# Altium footprint library PcbLib.PcbLib: 428 footprints (part 19 of 27)
Each footprint in its own frame and in the unit in brackets; x right, y up, seen from the top. Pads: shape width x height; smd on the part's side, far side on the other; paste and mask are expansions set on the pad; w line width, h text height; cw(c..) or ccw(c..) is an arc to the next point about the centre after c.
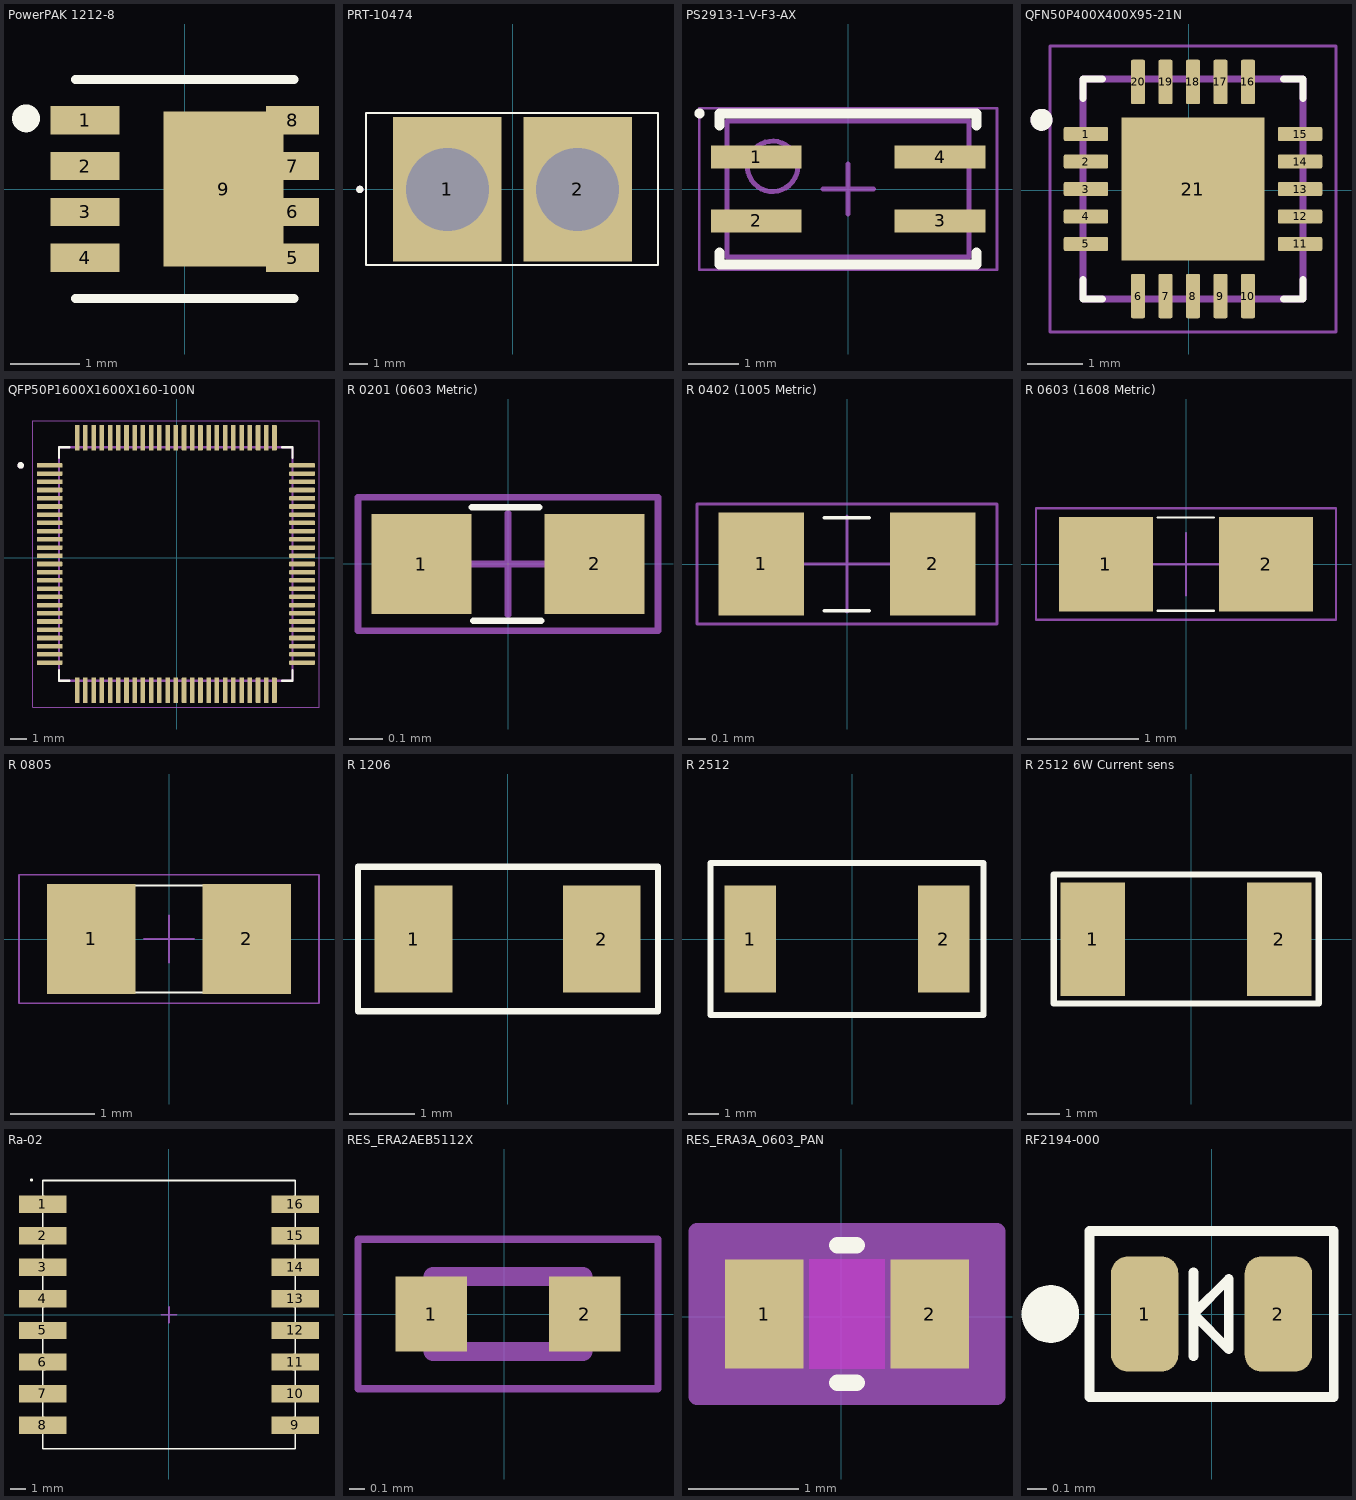
[diagram p18: the footprints below, top view; thin cyan lines are the x and y axes]

## PowerPAK 1212-8 [mm]
pads (9):
  rect 0.99x0.405 smd: 1(-1.435,0.99) 2(-1.435,0.33) 3(-1.435,-0.33) 4(-1.435,-0.99)
  rect 0.76x0.405 smd: 5(1.55,-0.99) 6(1.55,-0.33) 7(1.55,0.33) 8(1.55,0.99)
  rect 1.725x2.235 smd: 9(0.557,0)
Top Overlay:
  circle w0.2: c-2.286,1.016 r0.1
  lines w0.127: -1.575,-1.575 1.575,-1.575 ; -1.575,1.575 1.575,1.575
3D body "SI7611DN-T1-GE3.step": height 1.12, standoff 0, extent -1.651,-1.651 1.651,1.651

## PRT-10474 [mm]
pads (2):
  rect 6x8 hole 4.6: 1(-3.6,0) 2(3.6,0)
Top Overlay:
  circle w0.2: c-8.45,0 r0.1
  lines w0.127: -8.11,-4.18 -8.11,4.22 8.05,4.22 8.05,-4.18 -8.11,-4.18
Mechanical 13:
  circle w0.2: c-8.45,0 r0.1
3D body "XT60 Plug v4.step": height 17, standoff -4.4, extent -8.04,-3.94 7.96,3.96

## PS2913-1-V-F3-AX [mm] "SON, 4-Leads, Body 2.50x4.60mm, Pitch 1.27mm, IPC Medium Density"
height 2.1
pads (4):
  rect 1.8x0.45 smd: 1(-1.825,0.635) 2(-1.825,-0.635) 3(1.825,-0.635) 4(1.825,0.635)
Top Overlay:
  circle w0.1: c-2.95,1.5 r0.05
  lines w0.2: -2.55,-1.26 -2.55,-1.5 2.55,-1.5 2.55,-1.26 ; -2.55,1.26 -2.55,1.5 2.55,1.5 2.55,1.26
Mechanical 13:
  circle w0.1: c-1.5,0.45 r0.5
  lines w0.1: -2.4,-1.35 -2.4,1.35 2.4,1.35 2.4,-1.35 -2.4,-1.35
Mechanical 15:
  lines w0.05: -2.955,-1.6 -2.955,1.6 2.955,1.6 2.955,-1.6 -2.955,-1.6
  lines w0.1: -0.5,0 0.5,0 ; 0,-0.5 0,0.5
3D body "SON127P460X210-4N.step": height 2.1, standoff 0.05, extent -2.4,-1.35 2.4,1.35

## QFN50P400X400X95-21N [mm]
pads (21):
  rrect25% 0.81x0.26 smd: 1(-1.874,1.025) 2(-1.874,0.525) 3(-1.874,0.025) 4(-1.874,-0.475) 5(-1.874,-0.975) 11(2.026,-0.975) 12(2.026,-0.475) 13(2.026,0.025) 14(2.026,0.525) 15(2.026,1.025)
  rrect25% 0.26x0.81 smd: 6(-0.924,-1.925) 7(-0.424,-1.925) 8(0.076,-1.925) 9(0.576,-1.925) 10(1.076,-1.925) 16(1.076,1.975) 17(0.576,1.975) 18(0.076,1.975) 19(-0.424,1.975) 20(-0.924,1.975)
  rect 2.6x2.6 smd paste-2: 21(0.076,0.025)
Top Overlay:
  circle w0.2: c-2.684,1.285 r0.1
  lines w0.127: -1.924,-1.625 -1.924,-1.975 -1.574,-1.975 ; -1.924,1.675 -1.924,2.025 -1.574,2.025 ; 1.726,-1.975 2.076,-1.975 2.076,-1.625 ; 1.726,2.025 2.076,2.025 2.076,1.675
Top Paste:
  region: 1.056,0.186 0.236,0.186 0.236,1.005 1.056,1.005
  region: -0.084,0.186 -0.905,0.186 -0.905,1.005 -0.084,1.005
  region: -0.084,-0.955 -0.904,-0.955 -0.904,-0.135 -0.084,-0.135
  region: 1.056,-0.955 0.236,-0.955 0.236,-0.135 1.056,-0.135
Mechanical 13:
  circle w0.2: c-2.684,1.285 r0.1
  lines w0.127: -1.924,-1.975 2.076,-1.975 2.076,2.025 -1.924,2.025 -1.924,-1.975
Mechanical 15:
  lines w0.05: -2.529,-2.58 2.681,-2.58 2.681,2.63 -2.529,2.63 -2.529,-2.58
3D body "step_temp.STEP": height 0.95, standoff 0, extent -1.924,-1.975 2.076,2.025

## QFP50P1600X1600X160-100N [mm]
pads (100):
  rrect25% 1.56x0.28 smd: 1(-7.731,5.619) 2(-7.731,5.119) 3(-7.731,4.619) 4(-7.731,4.119) 5(-7.731,3.619) 6(-7.731,3.119) 7(-7.731,2.619) 8(-7.731,2.119) 9(-7.731,1.619) 10(-7.731,1.119) 11(-7.731,0.619) 12(-7.731,0.119) 13(-7.731,-0.381) 14(-7.731,-0.881) 15(-7.731,-1.381) 16(-7.731,-1.881) 17(-7.731,-2.381) 18(-7.731,-2.881) 19(-7.731,-3.381) 20(-7.731,-3.881) 21(-7.731,-4.381) 22(-7.731,-4.881) 23(-7.731,-5.381) 24(-7.731,-5.881) 25(-7.731,-6.381) 51(7.629,-6.381) 52(7.629,-5.881) 53(7.629,-5.381) 54(7.629,-4.881) 55(7.629,-4.381) 56(7.629,-3.881) 57(7.629,-3.381) 58(7.629,-2.881) 59(7.629,-2.381) 60(7.629,-1.881) 61(7.629,-1.381) 62(7.629,-0.881) 63(7.629,-0.381) 64(7.629,0.119) 65(7.629,0.619) 66(7.629,1.119) 67(7.629,1.619) 68(7.629,2.119) 69(7.629,2.619) 70(7.629,3.119) 71(7.629,3.619) 72(7.629,4.119) 73(7.629,4.619) 74(7.629,5.119) 75(7.629,5.619)
  rrect25% 0.28x1.56 smd: 26(-6.051,-8.061) 27(-5.551,-8.061) 28(-5.051,-8.061) 29(-4.551,-8.061) 30(-4.051,-8.061) 31(-3.551,-8.061) 32(-3.051,-8.061) 33(-2.551,-8.061) 34(-2.051,-8.061) 35(-1.551,-8.061) 36(-1.051,-8.061) 37(-0.551,-8.061) 38(-0.051,-8.061) 39(0.449,-8.061) 40(0.949,-8.061) 41(1.449,-8.061) 42(1.949,-8.061) 43(2.449,-8.061) 44(2.949,-8.061) 45(3.449,-8.061) 46(3.949,-8.061) 47(4.449,-8.061) 48(4.949,-8.061) 49(5.449,-8.061) 50(5.949,-8.061) 76(5.949,7.299) 77(5.449,7.299) 78(4.949,7.299) 79(4.449,7.299) 80(3.949,7.299) 81(3.449,7.299) 82(2.949,7.299) 83(2.449,7.299) 84(1.949,7.299) 85(1.449,7.299) 86(0.949,7.299) 87(0.449,7.299) 88(-0.051,7.299) 89(-0.551,7.299) 90(-1.051,7.299) 91(-1.551,7.299) 92(-2.051,7.299) 93(-2.551,7.299) 94(-3.051,7.299) 95(-3.551,7.299) 96(-4.051,7.299) 97(-4.551,7.299) 98(-5.051,7.299) 99(-5.551,7.299) 100(-6.051,7.299)
Top Overlay:
  circle w0.2: c-9.491,5.619 r0.1
  lines w0.127: -7.151,-6.841 -7.151,-7.481 -6.511,-7.481 ; -7.151,6.079 -7.151,6.719 -6.511,6.719 ; 6.409,-7.481 7.049,-7.481 7.049,-6.841 ; 6.409,6.719 7.049,6.719 7.049,6.079
Mechanical 13:
  circle w0.2: c-9.491,5.619 r0.1
  lines w0.127: -7.151,-7.481 -7.151,6.719 7.049,6.719 7.049,-7.481 -7.151,-7.481
Mechanical 15:
  lines w0.05: -8.761,-9.091 -8.761,8.329 8.659,8.329 8.659,-9.091 -8.761,-9.091
3D body "step_temp.STEP": height 1.6, standoff 0, extent -8.051,-8.381 7.949,7.619

## R 0201 (0603 Metric) [mm]
pads (2):
  rect 0.3x0.3 smd paste+0 mask+0: 1(-0.26,0) 2(0.26,0)
Top Overlay:
  lines w0.02: -0.109,0.17 0.094,0.17 ; -0.104,-0.171 0.099,-0.17
Mechanical 15:
  lines w0.02: -0.254,0 0.254,0 ; 0,-0.152 0,0.152 ; -0.45,-0.2 0.45,-0.2 0.45,0.2 -0.45,0.2 -0.45,-0.2
3D body "User Library-res0201-1.STEP": height 0.23, standoff 0, extent -0.3,-0.15 0.3,0.15

## R 0402 (1005 Metric) [mm] "Chip Capacitor, Body 1.0x0.5mm, IPC High Density"
height 1.3
pads (2):
  rect 0.5x0.6 smd: 1(-0.5,0) 2(0.5,0)
Top Overlay:
  lines w0.02: -0.132,-0.272 0.13,-0.272 ; -0.132,0.271 0.13,0.271
Mechanical 15:
  lines w0.02: -0.3,0 0.3,0 ; 0,-0.279 0,0.279 ; -0.875,-0.35 0.875,-0.35 0.875,0.35 -0.875,0.35 -0.875,-0.35
3D body "User Library-CR1005-0402.STEP": height 0.35, standoff 0, extent -0.5,-0.25 0.5,0.25

## R 0603 (1608 Metric) [mm]
pads (2):
  rect 0.85x0.85 smd paste+0 mask+0: 1(-0.72,0) 2(0.72,0)
Top Overlay:
  lines w0.02: -0.257,-0.419 0.251,-0.419 ; -0.257,0.42 0.251,0.42
Mechanical 15:
  lines w0.02: -0.3,0 0.3,0 ; 0,-0.279 0,0.279 ; -1.35,-0.5 -1.35,0.505 1.35,0.505 1.35,-0.5 -1.35,-0.5
3D body "SW3dPS-R0603.STEP": height 0.37, standoff 0, extent -0.8,-0.401 0.8,0.401

## R 0805 [mm]
pads (2):
  rect 1.05x1.3 smd paste+0 mask+0: 1(-0.923,0) 2(0.923,0)
Top Overlay:
  lines w0.02: -0.559,-0.635 0.533,-0.635 ; -0.546,0.635 0.546,0.635
Mechanical 15:
  lines w0.02: -0.3,0 0.3,0 ; 0,-0.279 0,0.279 ; -1.778,-0.762 -1.778,0.762 1.778,0.762 1.778,-0.762 -1.778,-0.762
3D body "SW3dPS-R0805.STEP": height 0.47, standoff 0, extent -1,-0.626 1,0.626

## R 1206 [mm]
pads (2):
  rect 1.2x1.65 smd: 1(-1.45,0) 2(1.45,0)
Top Overlay:
  lines w0.1: -2.308,-1.112 -2.308,1.116 2.317,1.116 2.317,-1.112 -2.308,-1.112
3D body "User Library-1206CRCW.step": height 0.56, standoff 0, extent -1.583,-0.792 1.617,0.808

## R 2512 [mm]
pads (2):
  rect 1.7x3.5 smd: 1(-3.345,0) 2(3.011,0)
Top Overlay:
  lines w0.2: -4.655,-2.5 -4.655,2.5 -3.5,2.5 4.312,2.5 4.312,-2.5 -4.655,-2.5
3D body "RMCF2512.stp": height 0.54, standoff -0.01, extent -3.282,-1.603 3.018,1.597

## R 2512 6W Current sens [mm]
pads (2):
  rect 2x3.5 smd: 1(-3.045,0) 2(2.711,0)
Top Overlay:
  lines w0.2: -4.24,-1.98 3.93,-1.98 3.93,2 -4.24,2 -4.24,-1.98
3D body "RES_L500x_BRN.step": height 1.22, standoff 0, extent -3.358,-1.593 3.118,1.633

## Ra-02 [mm] "Chip Array, Concave, 16-Leads, Pitch 2.00mm,  Body 17.00x16.00mm,  IPC Medium Density"
height 0.6
pads (16):
  rect 3x1.1 smd: 1(-8,7) 2(-8,5) 3(-8,3) 4(-8,1) 5(-8,-1) 6(-8,-3) 7(-8,-5) 8(-8,-7) 9(8,-7) 10(8,-5) 11(8,-3) 12(8,-1) 13(8,1) 14(8,3) 15(8,5) 16(8,7)
Top Overlay:
  circle w0.1: c-8.712,8.538 r0.05
  lines w0.1: -8,-8.5 -8,-7.5 ccw(c-8,-7) -8,-6.5 -8,-5.5 ccw(c-8,-5) -8,-4.5 -8,-3.5 ccw(c-8,-3) -8,-2.5 -8,-1.5 ccw(c-8,-1) -8,-0.5 -8,0.5 ccw(c-8,1) -8,1.5 -8,2.5 ccw(c-8,3) -8,3.5 -8,4.5 ccw(c-8,5) -8,5.5 -8,6.5 ccw(c-8,7) -8,7.5 -8,8.5 8,8.5 8,7.5 ccw(c8,7) 8,6.5 8,5.5 ccw(c8,5) 8,4.5 8,3.5 ccw(c8,3) 8,2.5 8,1.5 ccw(c8,1) 8,0.5 8,-0.5 ccw(c8,-1) 8,-1.5 8,-2.5 ccw(c8,-3) 8,-3.5 8,-4.5 ccw(c8,-5) 8,-5.5 8,-6.5 ccw(c8,-7) 8,-7.5 8,-8.5 -8,-8.5
Top Courtyard:
  lines w0.1: -0.5,0 0.5,0 ; 0,-0.5 0,0.5
3D body "User Library-RA-02-2.STEP": height 3.3, standoff 0.1, extent -8.042,-8.544 7.958,8.456

## RES_ERA2AEB5112X [mm]
pads (2):
  rect 0.475x0.5 smd: 1(-0.487,0) 2(0.537,0)
Mechanical 13:
  lines w0.127: -0.475,-0.25 0.525,-0.25 0.525,0.25 -0.475,0.25 -0.475,-0.25
Mechanical 15:
  lines w0.05: -0.975,-0.5 1.025,-0.5 1.025,0.5 -0.975,0.5 -0.975,-0.5

## RES_ERA3A_0603_PAN [mil]
pads (2):
  rect 28x39 smd paste+0 mask+0: 1(-27.5,1) 2(31.5,1)
Top Layer keep-out:
  region: -11.5,-16.5 -11.5,18.5 15.5,18.5 15.5,-16.5
Top Overlay:
  lines w6: -1.39,-23.5 5.39,-23.5 ; -1.39,25.5 5.39,25.5
Keep-Out Layer:
  region: -11.5,-18.5 -11.5,20.5 15.5,20.5 15.5,-18.5
Mechanical 13:
  lines w1: -33.5,-18.5 -33.5,20.5 ; -33.5,-18.5 -13.5,-18.5 -13.5,20.5 -33.5,20.5 ; -33.5,-18.5 37.5,-18.5 ; -33.5,-18.5 -33.5,20.5 ; -33.5,20.5 37.5,20.5 ; 37.5,-18.5 17.5,-18.5 17.5,20.5 37.5,20.5 ; 37.5,-18.5 37.5,20.5 ; 37.5,-18.5 37.5,20.5
Mechanical 15:
  region: 55.5,-28.5 -51.5,-28.5 -51.5,30.5 55.5,30.5
  lines w6: -51.5,-28.5 -51.5,30.5 55.5,30.5 55.5,-28.5 -51.5,-28.5
3D body "RES_ERA3A_0603_PAN.step": height 22.01, standoff 0, extent -33.51,-18.49 37.51,20.49

## RF2194-000 [mm]
pads (2):
  rrect50% 0.35x0.6 smd paste-0.017 mask+0.07: 1(-0.348,0) 2(0.348,0)
Top Overlay:
  circle w0.15: c-0.838,0 r0.075
  lines w0.05: -0.094,-0.22 -0.094,0.216 ; -0.635,-0.432 -0.635,0.432 0.635,0.432 0.635,-0.432 -0.635,-0.432 ; -0.094,0 0.09,-0.184 0.09,0.184 -0.094,0
3D body "step_temp.STEP": height 0.45, standoff 0, extent -0.5,-0.3 0.5,0.3